# Altium schematic symbol library lib_datalogger.SchLib: 1246 symbols (part 11 of 16) (continued)
## CMP-018-000030-1 (continued)
footprint CR1608-0603 (Chip Resistor; Body 1.6 x 0.8 mm (LxW typ))
pins: 1, 2

## CMP-018-000031-1
designator R?, comment RES 10K OHM 5% 1/4W 1206 SMD  Tolerance: 5%  Case/Package: 1206  Resistance: 100kR  Manufacturer: Susumu  Max Operating Temperature: 125°C  Min Operating Temperature: -55°C  Packaging: Tape and Reel  Composition: Thin Film
RES SMD 10K OHM 5% 1/4W 1206; Manufacturer Part Number: HRG3216P-1003-D-T1; Temperature Coefficient: 25ppm/°C; Length: 0.126inch; Features: Moisture Resistant,Automotive AEC-Q200,Anti-Sulfur; Source: mits.SchLib; Width: 0.065inch; Max Power Dissipation: 1/4W; Case Code (Imperial): 1206; RoHS: Yes; Case Code (Metric): 3216; Category: Chip SMD Resistors; ComponentLink1Description: http://industrial.panasonic.com/www-cgi/jvcr13pz.cgi?E+PZ+3+AOA0001+ERJ8GEYJ271V+7+WW; ComponentLink2Description: http://www.susumu.co.jp/common/pdf/n_catalog_partition24_en.pdf?src-supplier=Digi-Key; ComponentLink1URL: http://industrial.panasonic.com/www-cgi/jvcr13pz.cgi?E+PZ+3+AOA0001+ERJ8GEYJ271V+7+WW; Pricing 1: 1=0,97000, 10=0,83900, 100=0,58440 (USD); Stock 1: 1091; Height: 0.022inch; ComponentLink2URL: http://www.susumu.co.jp/common/pdf/n_catalog_partition24_en.pdf?src-supplier=Digi-Key; Design Item ID: RES 10K OHM 5% 1/4W 1206 SMD; Number of Terminations: 2
footprint CR1608-0603 (Chip Resistor; Body 1.6 x 0.8 mm (LxW typ))
footprint CR3216-1206 (Chip Capacitor; Body 3.2 x 1.6 mm (LxW typ))
pins: 1, 2

## CMP-018-000032-1
designator R?, comment RES 12K OHM 1% 1/8W 0805 SMD  Tolerance: ±1%  Manufacturer: Panasonic Electronic Components  Composition: Thick Film  Packaging: Cut Tape (CT)
RES SMD 12K OHM 1% 1/8W 0805; Manufacturer Part Number: ERJ-6ENF1202V; Temperature Coefficient: ±100ppm/°C; Power (Watts): 0.125W, 1/8W; Source: mits.SchLib; Number of Terminations: 2; ComponentLink1Description: https://industrial.panasonic.com/cdbs/www-data/pdf/RDA0000/AOA0000C283.pdf; Size / Dimension: 0.079" L x 0.049" W (2.00mm x 1.25mm); Height - Seated (Max): 0.028" (0.70mm); Pricing 1: 1=0.1, 10=0.036, 25=0.0264, 50=0.02, 100=0.0148, 250=0.01124, 500=0.009, 1000=0.00663 (USD); Package / Case: 0805 (2012 Metric); Failure Rate: -; Stock 1: 52615; Operating Temperature: -55°C ~ 155°C; Features: Automotive AEC-Q200; ComponentLink1URL: https://industrial.panasonic.com/cdbs/www-data/pdf/RDA0000/AOA0000C283.pdf; Part Status: Active; Category: Resistors; Resistance (Ohms): 12k; Supplier Device Package: 0805; RoHS: RoHS Compliant; Design Item ID: RES 12K OHM 1% 1/8W 0805 SMD
footprint CR1608-0603 (Chip Resistor; Body 1.6 x 0.8 mm (LxW typ))
footprint CR2012-0805 (Chip Capacitor)
pins: 1, 2

## CMP-018-000033-1
designator R?, comment RES 15K OHM 1% 1/2W 0805 SMD  Composition: Thick Film  Min Operating Temperature: -55°C  Resistance: 15kR  Voltage Rating: 150V  Packaging: Cut Tape  Case/Package: 0805  Manufacturer: Panasonic  Tolerance: 1%  Max Operating Temperature: 155°C
RES SMD 15 kohm   1% 1/2W 0805; Manufacturer Part Number: ERJ-P6WF1502V; Temperature Coefficient: 200ppm/°C; Power Rating: 500mW; Width: 0.049inch; Case Code (Imperial): 0805; REACH SVHC: No SVHC; Length: 0.079inch; ComponentLink2URL: https://datasheet.ciiva.com/48525/erjp-series-eng-tds-48525477.pdf?src-supplier=Distrelec; Category: Chip SMD Resistors; Number of Terminations: 2; Pricing 1: 1=0,54000, 10=0,41200, 100=0,17310, 1000=0,09552, 2500=0,08955 (USD); Voltage Rating (DC): 150V; ComponentLink1URL: http://www.yageo.com/documents/recent/PYu-RC_Group_51_RoHS_L_04.pdf; RoHS: Yes; ComponentLink1Description: http://www.yageo.com/documents/recent/PYu-RC_Group_51_RoHS_L_04.pdf; Design Item ID: RES 15K OHM 1% 1/2W 0805 SMD; Height: 0.03inch; Max Power Dissipation: 500mW; Termination: Flat; Contact Plating: Tin; ComponentLink2Description: https://datasheet.ciiva.com/48525/erjp-series-eng-tds-48525477.pdf?src-supplier=Distrelec; Stock 1: 4979; Source: mits.SchLib; Depth: 1.25mm; Case Code (Metric): 2012; Features: Automotive AEC-Q200
footprint CR1608-0603 (Chip Resistor; Body 1.6 x 0.8 mm (LxW typ))
footprint CR2012-0805 (Chip Capacitor)
pins: 1, 2

## CMP-018-000034-1
designator R?, comment RES 1K2 OHM 1% 1/8W 0805 SMD  Composition: Thick Film  Packaging: Cut Tape (CT)  Tolerance: ±1%  Manufacturer: Panasonic Electronic Components
RES SMD 1.2K OHM 1% 1/8W 0805; Manufacturer Part Number: ERJ-6ENF1201V; Power (Watts): 0.125W, 1/8W; Temperature Coefficient: ±100ppm/°C; Size / Dimension: 0.079" L x 0.049" W (2.00mm x 1.25mm); RoHS: RoHS Compliant; Category: Resistors; Resistance (Ohms): 1.2k; ComponentLink1URL: https://industrial.panasonic.com/cdbs/www-data/pdf/RDA0000/AOA0000C283.pdf; Height - Seated (Max): 0.028" (0.70mm); Operating Temperature: -55°C ~ 155°C; Package / Case: 0805 (2012 Metric); Part Status: Active; Stock 1: 37968; ComponentLink1Description: https://industrial.panasonic.com/cdbs/www-data/pdf/RDA0000/AOA0000C283.pdf; Failure Rate: -; Pricing 1: 1=0.1, 10=0.036, 25=0.0264, 50=0.02, 100=0.0148, 250=0.01124, 500=0.009, 1000=0.00663 (USD); Supplier Device Package: 0805; Design Item ID: RES 1K2 OHM 1% 1/8W 0805 SMD; Source: mits.SchLib; Features: Automotive AEC-Q200
footprint CR1608-0603 (Chip Resistor; Body 1.6 x 0.8 mm (LxW typ))
footprint CR2012-0805 (Chip Capacitor)
pins: 1, 2

## CMP-018-000035-1
designator R?, comment RES 22K OHM 1% 1/8W 0805 SMD  Composition: Thick Film  Packaging: Cut Tape (CT)  Manufacturer: Panasonic Electronic Components  Tolerance: ±1%
RES SMD 22K OHM 1% 1/8W 0805; Manufacturer Part Number: ERJ-6ENF2202V; Temperature Coefficient: ±100ppm/°C; Power (Watts): 0.125W, 1/8W; Category: Resistors; Supplier Device Package: 0805; Source: mits.SchLib; Package / Case: 0805 (2012 Metric); RoHS: RoHS Compliant; Part Status: Active; Resistance (Ohms): 22k; ComponentLink1Description: https://industrial.panasonic.com/cdbs/www-data/pdf/RDA0000/AOA0000C283.pdf; Failure Rate: -; Size / Dimension: 0.079" L x 0.049" W (2.00mm x 1.25mm); Stock 1: 26406; Features: Automotive AEC-Q200; Design Item ID: RES 22K OHM 1% 1/8W 0805 SMD; Height - Seated (Max): 0.028" (0.70mm); Pricing 1: 1=0.1, 10=0.036, 25=0.0264, 50=0.02, 100=0.0148, 250=0.01124, 500=0.009, 1000=0.00663 (USD); Operating Temperature: -55°C ~ 155°C; ComponentLink1URL: https://industrial.panasonic.com/cdbs/www-data/pdf/RDA0000/AOA0000C283.pdf
footprint CR1608-0603 (Chip Resistor; Body 1.6 x 0.8 mm (LxW typ))
footprint CR2012-0805 (Chip Capacitor)
pins: 1, 2

## CMP-018-000036-1
designator R?, comment RES 22R OHM 1% 1/8W 0805 SMD  Packaging: Cut Tape (CT)  Manufacturer: Yageo  Composition: Thick Film  Tolerance: ±1%
RES SMD 22 OHM 1% 1/8W 0805; Manufacturer Part Number: RC0805FR-0722RL; Resistance (Ohms): 22; Temperature Coefficient: ±100ppm/°C; Power (Watts): 0.125W, 1/8W; Part Status: Active; Design Item ID: RES 22R OHM 1% 1/8W 0805 SMD; Pricing 1: 1=0.1, 10=0.019, 25=0.0136, 50=0.0104, 100=0.0077, 250=0.00584, 500=0.00468, 1000=0.00345 (USD); Failure Rate: -; Height - Seated (Max): 0.024" (0.60mm); Features: Moisture Resistant; Source: mits.SchLib; Size / Dimension: 0.079" L x 0.049" W (2.00mm x 1.25mm); RoHS: RoHS Compliant; Operating Temperature: -55°C ~ 155°C; ComponentLink1URL: http://www.yageo.com/documents/recent/PYu-RC_Group_51_RoHS_L_6.pdf; Package / Case: 0805 (2012 Metric); Stock 1: 666127; ComponentLink1Description: http://www.yageo.com/documents/recent/PYu-RC_Group_51_RoHS_L_6.pdf; Category: Resistors; Supplier Device Package: 0805
footprint CR1608-0603 (Chip Resistor; Body 1.6 x 0.8 mm (LxW typ))
footprint CR2012-0805 (Chip Capacitor)
pins: 1, 2

## CMP-018-000037-1
designator R?, comment RES 274 OHM 1% 1/8W 0805 SMD  Packaging: Cut Tape (CT)  Manufacturer: Panasonic Electronic Components  Composition: Thick Film  Tolerance: ±1%
RES SMD 274 OHM 1% 1/8W 0805; Manufacturer Part Number: ERJ-6ENF2740V; Resistance (Ohms): 274; Temperature Coefficient: ±100ppm/°C; Power (Watts): 0.125W, 1/8W; Package / Case: 0805 (2012 Metric); Operating Temperature: -55°C ~ 155°C; ComponentLink1URL: https://industrial.panasonic.com/cdbs/www-data/pdf/RDA0000/AOA0000C283.pdf; Source: mits.SchLib; Part Status: Active; Failure Rate: -; ComponentLink1Description: https://industrial.panasonic.com/cdbs/www-data/pdf/RDA0000/AOA0000C283.pdf; Supplier Device Package: 0805; Height - Seated (Max): 0.028" (0.70mm); RoHS: RoHS Compliant; Pricing 1: 1=0.1, 10=0.036, 25=0.0264, 50=0.02, 100=0.0148, 250=0.01124, 500=0.009, 1000=0.00663 (USD); Category: Resistors; Design Item ID: RES 274 OHM 1% 1/8W 0805 SMD; Size / Dimension: 0.079" L x 0.049" W (2.00mm x 1.25mm); Stock 1: 55174; Features: Automotive AEC-Q200
footprint CR1608-0603 (Chip Resistor; Body 1.6 x 0.8 mm (LxW typ))
footprint CR2012-0805 (Chip Capacitor)
pins: 1, 2

## CMP-018-000038-1
designator R?, comment RES 2K2 OHM 1/8W 5% 0805 SMD  Composition: Thick Film  Tolerance: ±5%  Packaging: Cut Tape (CT)  Manufacturer: Panasonic Electronic Components
RES SMD 2.2K OHM 5% 1/8W 0805; Part#: ERJ-6GEYJ222V; Power (Watts): 0.125W, 1/8W; Temperature Coefficient: ±200ppm/°C; eVendor: Digi-Key; MSRP: 0,00459; eVendorPrice: 0,10; eVendor#: P2.2KACT-ND; Stock 1: 100522; ComponentLink1Description: http://industrial.panasonic.com/www-cgi/jvcr13pz.cgi?E+PZ+3+AOA0001+ERJ6GEYJ222V+7+WW; Features: Automotive AEC-Q200; Failure Rate: -; Part Status: Active; Design Item ID: RES 2K2 OHM 1/8W 5% 0805 SMD; Obs: ERJ-6GEYJ222V; Datasheet: http://industrial.panasonic.com/www-cgi/jvcr13pz.cgi?E+PZ+3+AOA0001+ERJ6GEYJ222V+7+WW; Height - Seated (Max): 0.028" (0.70mm); Operating Temperature: -55°C ~ 155°C; Category: Resistors; MOQ: 2500; ComponentLink1URL: http://industrial.panasonic.com/www-cgi/jvcr13pz.cgi?E+PZ+3+AOA0001+ERJ6GEYJ222V+7+WW; Package / Case: 0805 (2012 Metric); Resistance (Ohms): 2.2k; Source: mits.SchLib; Manufacturer Part Number: ERJ-6GEYJ222V; Number of Terminations: 2; RoHS: RoHS Compliant; Size / Dimension: 0.079" L x 0.049" W (2.00mm x 1.25mm); Supplier Device Package: 0805; Pricing 1: 1=0.1, 10=0.025, 25=0.018, 50=0.0136, 100=0.01, 250=0.00764, 500=0.00612, 1000=0.00451 (USD)
footprint CR1608-0603 (Chip Resistor; Body 1.6 x 0.8 mm (LxW typ))
footprint CR2012-0805 (Chip Capacitor)
pins: 1, 2

## CMP-018-000039-2
designator R?, comment RES 33K OHM 5% 1/8W 0805 SMD  Min Operating Temperature: -55°C  Max Operating Temperature: 155°C  Case/Package: 0805  Packaging: Tape and Reel  Tolerance: 5%  Resistance: 33kR  RoHS Compliant: Yes
Res Thick Film 0805 33K Ohm 5% 0.125W(1/8W) ±200ppm/C Pad SMD Automotive T/R; Temperature Coefficient: 100ppm/°C; Max Power Dissipation: 125mW; Resistor Type: Thick Film; Mount: Surface Mount; Military Standard: Not; Size Code: 0805; Depth: 1.25mm; Case Code (Metric): 2012; Width: 0.049inch; Series: RMCF; Contact Plating: Tin,Matte; Radiation Hardening: No; Height: 0.026inch; Length: 2mm; Construction: Rectangular; Features: Automotive AEC-Q200; Power Rating: 125mW; Number of Terminations: 2; Lead Free: Lead Free; Case Code (Imperial): 0805
footprint CR2012-0805 (Chip Capacitor)
pins: 1, 2

## CMP-018-000040-1
designator R?, comment RES 34K OHM 1% 1/8W 0805 SMD  Manufacturer: Panasonic  Packaging: Tape and Reel  Composition: Thick Film  Tolerance: 1%  Resistance: 34kR  Package Quantity: 1  Max Operating Temperature: 155°C  Case/Package: 0805  Min Operating Temperature: -55°C  Voltage Rating: 150V
RES SMD 34K OHM 1% 1/8W 0805; Manufacturer Part Number: ERJ-6ENF3402V; Power Rating: 125mW; Temperature Coefficient: 100ppm/°C; ComponentLink1URL: http://www.yageo.com/documents/recent/PYu-RC_Group_51_RoHS_L_6.pdf; Category: Chip SMD Resistors; ComponentLink2URL: https://datasheet.ciiva.com/24163/aoa0000ce2-24163673.pdf?src-supplier=Mouser; REACH SVHC: No SVHC; Source: mits.SchLib; Termination: SMD/SMT; Stock 1: 43453; ComponentLink3URL: https://datasheet.ciiva.com/30170/aoa0000ce2-30170570.pdf?src-supplier=Onlinecomponents.com; ComponentLink1Description: http://www.yageo.com/documents/recent/PYu-RC_Group_51_RoHS_L_6.pdf; Height: 0.6mm; ComponentLink4Description: https://datasheet.ciiva.com/7870/aoa0000ce2-7870841.pdf?src-supplier=Element14; ComponentLink6Description: https://datasheet.ciiva.com/16768/70260748-16768797.pdf?src-supplier=Allied+Electronics; ComponentLink5Description: https://datasheet.ciiva.com/16760/70260748-16760441.pdf?src-supplier=Allied+Electronics; Case Code (Imperial): 0805; ComponentLink5URL: https://datasheet.ciiva.com/16760/70260748-16760441.pdf?src-supplier=Allied+Electronics; Mount: Surface Mount; Number of Terminations: 2; RoHS: Yes; Length: 2mm; ComponentLink4URL: https://datasheet.ciiva.com/7870/aoa0000ce2-7870841.pdf?src-supplier=Element14; ComponentLink6URL: https://datasheet.ciiva.com/16768/70260748-16768797.pdf?src-supplier=Allied+Electronics; Max Power Dissipation: 125mW; ComponentLink3Description: https://datasheet.ciiva.com/30170/aoa0000ce2-30170570.pdf?src-supplier=Onlinecomponents.com; Design Item ID: RES 34K OHM 1% 1/8W 0805 SMD; Radiation Hardening: No; Lead Free: Lead Free; Weight: 0.000194oz; Pricing 1: 1=0,10000, 10=0,07200, 100=0,02750, 1000=0,01210, 2500=0,01045 (USD); Case Code (Metric): 2012; Depth: 1.25mm; Features: Automotive AEC-Q200; Voltage Rating (DC): 150V; ComponentLink2Description: https://datasheet.ciiva.com/24163/aoa0000ce2-24163673.pdf?src-supplier=Mouser; Width: 0.049inch; Military Standard: Not; Contact Plating: Tin
footprint CR1608-0603 (Chip Resistor; Body 1.6 x 0.8 mm (LxW typ))
footprint CR2012-0805 (Chip Capacitor)
pins: 1, 2

## CMP-018-000041-1
designator R?, comment RES 390 OHM 1% 1/8W 0805 SMD  Tolerance: ±1%  Packaging: Cut Tape (CT)
RES SMD 390 OHM 1% 1/8W 0805; Manufacturer Part Number 1: 0805W8F3900T5E; Manufacturer 1: Uniroyal; Resistance (Ohms): 390; Power (Watts): 0.125W, 1/8W; Supplier Device Package: 0805; RoHS: RoHS Compliant; Source: mits.SchLib; Number of Terminations: 2; Part Status: Active; Design Item ID: RES 390 OHM 1% 1/8W 0805 SMD; Category: Resistors; ComponentLink1URL: http://industrial.panasonic.com/www-cgi/jvcr13pz.cgi?E+PZ+3+AOA0002+ERJ6ENF3652V+7+WW; ComponentLink1Description: http://industrial.panasonic.com/www-cgi/jvcr13pz.cgi?E+PZ+3+AOA0002+ERJ6ENF3652V+7+WW; Package / Case: 0805 (2012 Metric)
footprint CR1608-0603 (Chip Resistor; Body 1.6 x 0.8 mm (LxW typ))
footprint CR2012-0805 (Chip Capacitor)
pins: 1, 2

## CMP-018-000042-1
designator R?, comment RES 47R OHM 1% 1/4W 1206 SMD  Packaging: Cut Tape (CT)  Tolerance: ±1%  Composition: Thick Film  Manufacturer: Panasonic Electronic Components
RES SMD 47 OHM 1% 1/4W 1206; Manufacturer Part Number: ERJ-8ENF47R0V; Power (Watts): 0.25W, 1/4W; Resistance (Ohms): 47; Temperature Coefficient: ±100ppm/°C; Size / Dimension: 0.126" L x 0.063" W (3.20mm x 1.60mm); Pricing 1: 1=0.1, 10=0.046, 25=0.0336, 50=0.0256, 100=0.0189, 250=0.0144, 500=0.01152, 1000=0.00848 (USD); Category: Resistors; Operating Temperature: -55°C ~ 155°C; Part Status: Active; Features: Automotive AEC-Q200; ComponentLink1URL: https://industrial.panasonic.com/cdbs/www-data/pdf/RDA0000/AOA0000C283.pdf; Failure Rate: -; Design Item ID: RES 47R OHM 1% 1/4W 1206 SMD; Height - Seated (Max): 0.028" (0.70mm); Source: mits.SchLib; RoHS: RoHS Compliant; ComponentLink1Description: https://industrial.panasonic.com/cdbs/www-data/pdf/RDA0000/AOA0000C283.pdf; Package / Case: 1206 (3216 Metric); Stock 1: 129296; Supplier Device Package: 1206
footprint CR1608-0603 (Chip Resistor; Body 1.6 x 0.8 mm (LxW typ))
footprint CR3216-1206 (Chip Capacitor; Body 3.2 x 1.6 mm (LxW typ))
pins: 1, 2

## CMP-018-000043-1
designator R?, comment RES 5K6 OHM 1% 1/8W 0805 SMD  Min Operating Temperature: -55°C  Manufacturer: TE Connectivity  Case/Package: 0805  Max Operating Temperature: 125°C  Packaging: Tape and Reel  Resistance: 5.6kR  Tolerance: 1%  Voltage Rating: 150V  Composition: Thick Film
SMD CRG0805 1% 5K6; Manufacturer Part Number: CRG0805F5K6; Temperature Coefficient: 100ppm/°C; Number of Resistors: 1; Power Rating: 125mW; Radiation Hardening: No; Mount: Surface Mount; ComponentLink2URL: https://datasheet.ciiva.com/12563/eng-ds-1773204-g-12563327.pdf?src-supplier=Mouser; Case Code (Imperial): 0805; Category: Chip SMD Resistors; ComponentLink1URL: https://datasheet.ciiva.com/11809/0900766b800a696e-11809932.pdf?src-supplier=RSComponents; Source: mits.SchLib; ELV: Compliant; RoHS: Yes; Pricing 1: 1=0,10000, 10=0,04900, 100=0,02000, 1000=0,00898, 2500=0,00780 (USD); Number of Terminations: 2; Design Item ID: RES 5K6 OHM 1% 1/8W 0805 SMD; Depth: 1.25mm; Width: 1.25mm; Length: 2mm; ComponentLink1Description: https://datasheet.ciiva.com/11809/0900766b800a696e-11809932.pdf?src-supplier=RSComponents; Case Code (Metric): 2012; Height: 0.55mm; Termination: Solder; Stock 1: 27945; ComponentLink2Description: https://datasheet.ciiva.com/12563/eng-ds-1773204-g-12563327.pdf?src-supplier=Mouser
footprint CR1608-0603 (Chip Resistor; Body 1.6 x 0.8 mm (LxW typ))
footprint CR2012-0805 (Chip Capacitor)
pins: 1, 2

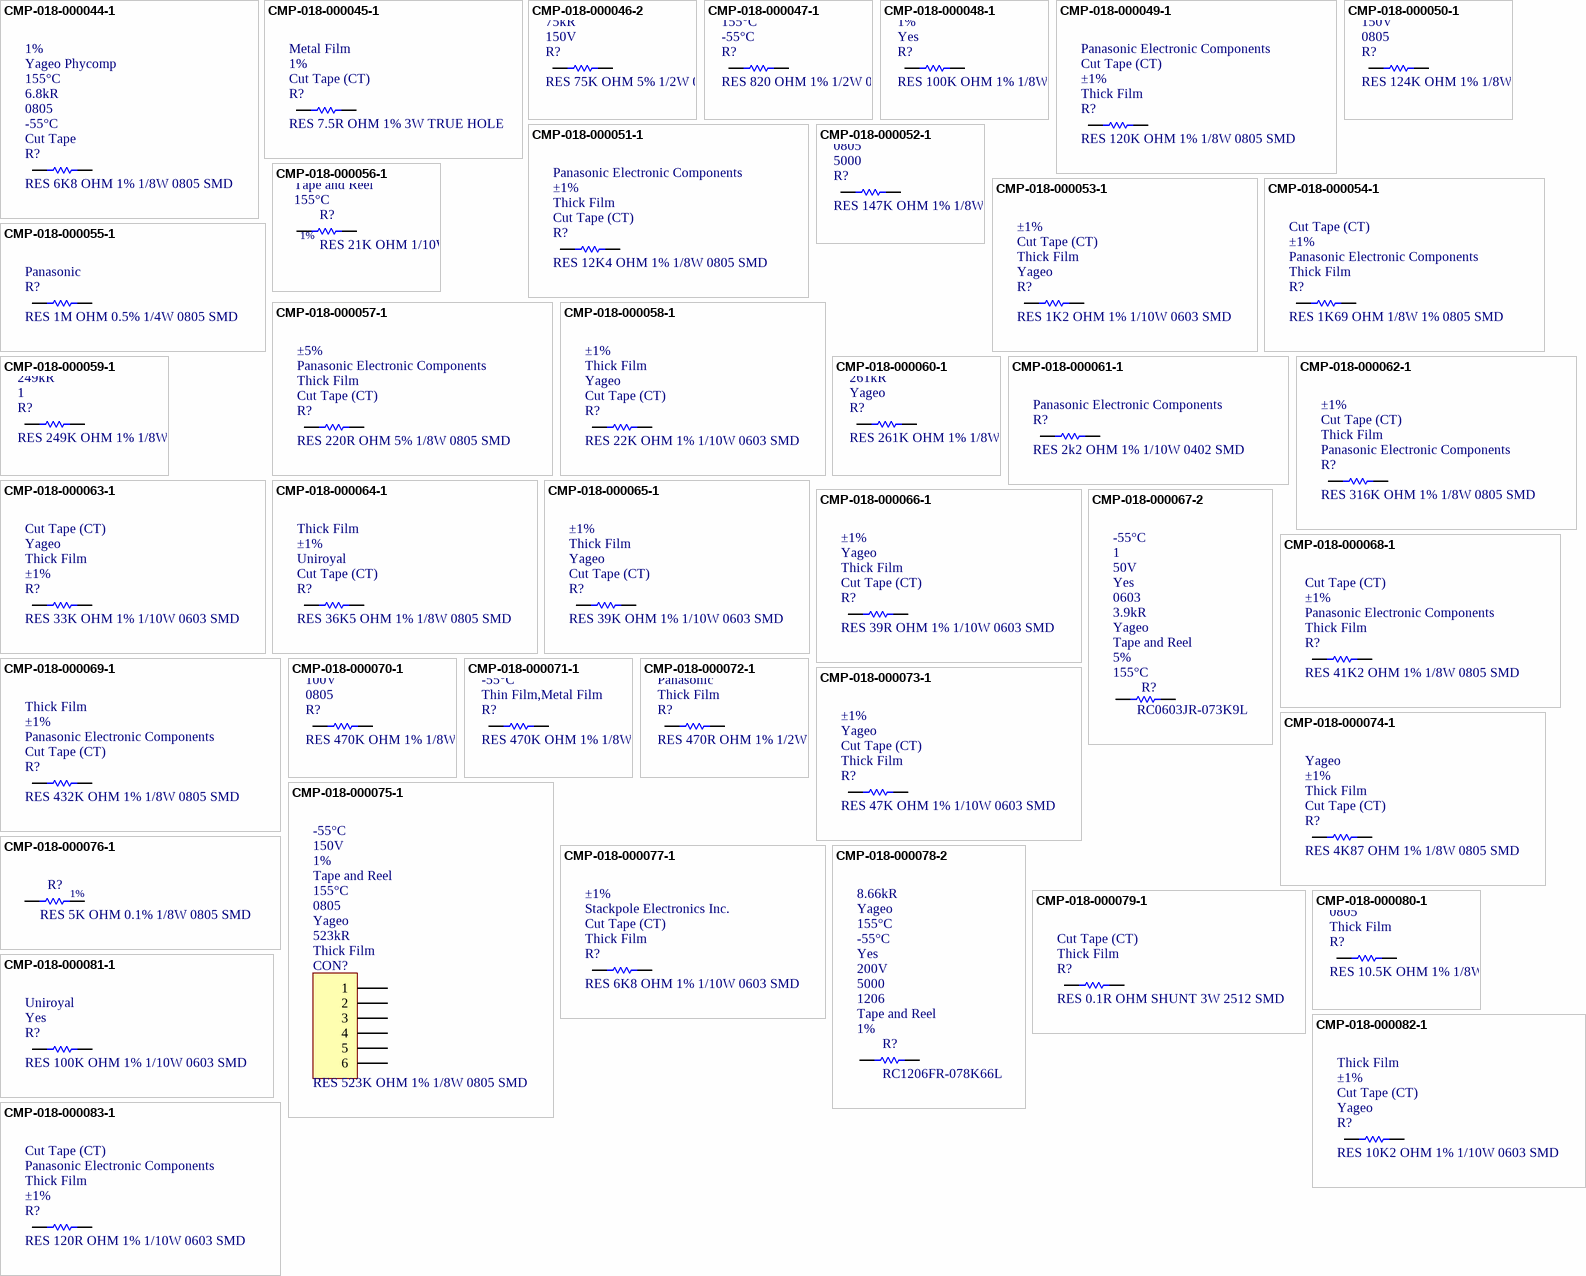
[diagram p33: symbols CMP-018-000044-1 to CMP-018-000083-1]

## CMP-018-000044-1
designator R?, comment RES 6K8 OHM 1% 1/8W 0805 SMD  Packaging: Cut Tape  Min Operating Temperature: -55°C  Case/Package: 0805  Resistance: 6.8kR  Max Operating Temperature: 155°C  Manufacturer: Yageo Phycomp  Tolerance: 1%
RES SMD 6K8 OHM 1% 1/8W 0805; Manufacturer Part Number: RC0805FR-076K8L; Power Rating: 125mW; Working Voltage: 150V; Temperature Coefficient: 100ppm/°C; Height: 0.5mm; RoHS: Yes; ComponentLink5URL: http://www.yageo.com/documents/recent/PYu-RC_Group_51_RoHS_L_10.pdf?src-supplier=Digi-Key; Depth: 1.25mm; Number of Pins: 2; ComponentLink3URL: http://www.farnell.com/datasheets/2167052.pdf?src-supplier=Farnell; Length: 2mm; Stock 1: 3961465; Source: mits.SchLib; ComponentLink5Description: http://www.yageo.com/documents/recent/PYu-RC_Group_51_RoHS_L_10.pdf?src-supplier=Digi-Key; Mount: Surface Mount; Number of Terminations: 2; ComponentLink2Description: http://www.mouser.com/ds/2/447/Yageo_08112016_RC0805-968729.pdf?src-supplier=Mouser; Voltage Rating (DC): 150V; Width: 1.25mm; REACH SVHC: No SVHC; Category: Chip SMD Resistors; Design Item ID: RES 6K8 OHM 1% 1/8W 0805 SMD; ComponentLink4URL: http://www.yageo.com/documents/recent/PYu-RC_Group_51_RoHS_L_9.pdf?src-supplier=Digi-Key; ComponentLink4Description: http://www.yageo.com/documents/recent/PYu-RC_Group_51_RoHS_L_9.pdf?src-supplier=Digi-Key; ComponentLink3Description: http://www.farnell.com/datasheets/2167052.pdf?src-supplier=Farnell; ComponentLink1URL: https://www.seielect.com/Catalog/SEI-RMCF_RMCP.pdf; ComponentLink2URL: http://www.mouser.com/ds/2/447/Yageo_08112016_RC0805-968729.pdf?src-supplier=Mouser; Pricing 1: 1=0,10000, 10=0,04000, 100=0,01630, 1000=0,00731, 2500=0,00635 (USD); Lead Free: Lead Free; ComponentLink1Description: https://www.seielect.com/Catalog/SEI-RMCF_RMCP.pdf
footprint CR1608-0603 (Chip Resistor; Body 1.6 x 0.8 mm (LxW typ))
footprint CR2012-0805 (Chip Capacitor)
pins: 1, 2

## CMP-018-000045-1
designator R?, comment RES 7.5R OHM 1% 3W TRUE HOLE  Packaging: Cut Tape (CT)  Tolerance: 1%  Composition: Metal Film
Manufeacturer Part Number 1: MF3WS-7.5Ω±1% T; Manufeacturer 1: CCO(Chian Chia Elec); Resistance (Ohms): 7.5; Design Item ID: RES 7.5R OHM 1% 3W TRUE HOLE; Power (Watts): 3W; Source: mits.SchLib; ComponentLink1URL: https://datasheet.lcsc.com/szlcsc/1811131131_CCO-Chian-Chia-Elec-MF3WS-7-5R-1-T_C119686.pdf; Category: Resistors; RoHS: RoHS Compliant; Supplier Device Package: Axial; Features: Resistor; Part Status: Active; Package / Case: Axial; ComponentLink1Description: datasheet
footprint CR1608-0603 (Chip Resistor; Body 1.6 x 0.8 mm (LxW typ))
footprint RES TRUE_HOLE
pins: 1, 2

## CMP-018-000046-2
designator R?, comment RES 75K OHM 5% 1/2W 0805 SMD  Voltage Rating: 150V  Resistance: 75kR  Packaging: Tape and Reel  Case/Package: 0805  Package Quantity: 1  Composition: Thick Film  Manufacturer: Panasonic  Max Operating Temperature: 155°C  Min Operating Temperature: -55°C  Tolerance: 5%
RES SMD 75K OHM 5% 1/2W 0805; Manufacturer Part Number: ERJ-P06J753V; Power Rating: 500mW; Temperature Coefficient: 200ppm/°C; Case Code (Metric): 2012; ComponentLink4URL: https://datasheet.ciiva.com/17208/aoa0000ce4-17208715.pdf?src-supplier=Avnet+Europe; Mount: Surface Mount; Voltage Rating (DC): 150V; ComponentLink4Description: https://datasheet.ciiva.com/17208/aoa0000ce4-17208715.pdf?src-supplier=Avnet+Europe; Design Item ID: RES 75K OHM 5% 1/2W 0805 SMD; Features: Automotive AEC-Q200; Contact Plating: Tin; Depth: 1.25mm; Category: Chip SMD Resistors; Case Code (Imperial): 0805; Height: 0.028inch; Pricing 1: 1=0,11000, 10=0,10300, 100=0,03960, 1000=0,01742, 2500=0,01505 (USD); Length: 2mm; Stock 1: 12699; RoHS: Yes; Lead Free: Contains Lead; ComponentLink3URL: https://datasheet.ciiva.com/9187/aoa0000ce4-9187849.pdf?src-supplier=Avnet; ComponentLink1URL: https://industrial.panasonic.com/cdbs/www-data/pdf/RDA0000/AOA0000C283.pdf; ComponentLink1Description: https://industrial.panasonic.com/cdbs/www-data/pdf/RDA0000/AOA0000C283.pdf; Radiation Hardening: No; Number of Terminations: 2; Width: 1.2mm; ComponentLink2Description: https://datasheet.ciiva.com/24042/aoa0000ce4-64075-24042568.pdf?src-supplier=Mouser; ComponentLink3Description: https://datasheet.ciiva.com/9187/aoa0000ce4-9187849.pdf?src-supplier=Avnet; Source: mits.SchLib; Military Standard: Not; Max Power Dissipation: 500mW; ComponentLink2URL: https://datasheet.ciiva.com/24042/aoa0000ce4-64075-24042568.pdf?src-supplier=Mouser
footprint CR1608-0603 (Chip Resistor; Body 1.6 x 0.8 mm (LxW typ))
footprint CR2012-0805 (Chip Capacitor)
pins: 1, 2

## CMP-018-000047-1
designator R?, comment RES 820 OHM 1% 1/2W 0805 SMD  Min Operating Temperature: -55°C  Max Operating Temperature: 155°C  Packaging: Cut Tape  Manufacturer: Panasonic  Resistance: 820R  Case/Package: 0805  Tolerance: 1%  Voltage Rating: 150V  Composition: Thick Film
RES SMD 820 OHM 1% 1/2W 0805; Manufacturer Part Number: ERJP6WF8200V; Temperature Coefficient: 200ppm/°C; Power Rating: 500mW; ComponentLink1URL: http://www.yageo.com/documents/recent/PYu-RC_Group_51_RoHS_L_7.pdf; ComponentLink5Description: https://datasheet.ciiva.com/48536/erjp-series-eng-tds-48536302.pdf?src-supplier=Distrelec; ComponentLink7Description: https://datasheet.ciiva.com/48531/aoa0000ce4-48531125.pdf?src-supplier=Avnet; ComponentLink2URL: https://datasheet.ciiva.com/48531/aoa0000ce4-48531226.pdf?src-supplier=Avnet; REACH SVHC: No SVHC; Depth: 1.25mm; Height: 0.03inch; Width: 0.049inch; Termination: Flat; ComponentLink6Description: https://datasheet.ciiva.com/6138/1790600-6138383.pdf?src-supplier=Farnell; Case Code (Imperial): 0805; ComponentLink7URL: https://datasheet.ciiva.com/48531/aoa0000ce4-48531125.pdf?src-supplier=Avnet; ComponentLink8URL: https://datasheet.ciiva.com/6137/1790600-6137853.pdf?src-supplier=Farnell; RoHS: Yes; ComponentLink6URL: https://datasheet.ciiva.com/6138/1790600-6138383.pdf?src-supplier=Farnell; ComponentLink4Description: https://datasheet.ciiva.com/48531/aoa0000ce4-48531222.pdf?src-supplier=Avnet; Case Code (Metric): 2012; Voltage Rating (DC): 150V; Max Power Dissipation: 500mW; ComponentLink2Description: https://datasheet.ciiva.com/48531/aoa0000ce4-48531226.pdf?src-supplier=Avnet; ComponentLink4URL: https://datasheet.ciiva.com/48531/aoa0000ce4-48531222.pdf?src-supplier=Avnet; Design Item ID: RES 820 OHM 1% 1/2W 0805 SMD; Contact Plating: Tin; Category: Chip SMD Resistors; ComponentLink3Description: https://datasheet.ciiva.com/7830/1790600-7830869.pdf?src-supplier=Element14; Number of Terminations: 2; ComponentLink5URL: https://datasheet.ciiva.com/48536/erjp-series-eng-tds-48536302.pdf?src-supplier=Distrelec; Pricing 1: 1=0,51300, 10=0,27930, 25=0,27650, 100=0,14350, 250=0,14190, 500=0,14060, 1000=0,08550 (USD); ComponentLink8Description: https://datasheet.ciiva.com/6137/1790600-6137853.pdf?src-supplier=Farnell; Features: Automotive AEC-Q200; Stock 1: 2072; ComponentLink1Description: http://www.yageo.com/documents/recent/PYu-RC_Group_51_RoHS_L_7.pdf; ComponentLink3URL: https://datasheet.ciiva.com/7830/1790600-7830869.pdf?src-supplier=Element14; Length: 0.079inch; Source: mits.SchLib
footprint CR1608-0603 (Chip Resistor; Body 1.6 x 0.8 mm (LxW typ))
footprint CR1608-0603 (Chip Resistor; Body 1.6 x 0.8 mm (LxW typ))
pins: 1, 2

## CMP-018-000048-1
designator R?, comment RES 100K OHM 1% 1/8W 0805 SMD  RoHS Compliant: Yes  Tolerance: 1%  Min Operating Temperature: -55°C  Voltage Rating: 150V  Lead Pitch: 0.4mm  Max Operating Temperature: 155°C  Package Quantity: 1  Case/Package: 0805  Resistance: 100kR  Manufacturer: Yageo  Packaging: Tape and Reel
Res Thick Film 0805 100K Ohm 1% 1/8W ±100ppm/°C Molded SMD Paper T/R; Manufacturer Part Number: RC0805FR-07100KL; Power Rating: 125mW; ComponentLink2Description: http://www.susumu.co.jp/common/pdf/n_catalog_partition24_en.pdf?src-supplier=Digi-Key; ComponentLink10Description: https://datasheet.ciiva.com/7941/1697719-7941676.pdf?src-supplier=Element14; Temperature Coefficient: 100ppm/°C; Number of Terminations: 2; Construction: Rectangular; ComponentLink1Description: http://industrial.panasonic.com/www-cgi/jvcr13pz.cgi?E+PZ+3+AOA0001+ERJ8GEYJ271V+7+WW; RoHS: Yes; ComponentLink10URL: https://datasheet.ciiva.com/7941/1697719-7941676.pdf?src-supplier=Element14; ComponentLink8Description: https://datasheet.ciiva.com/2457/pyu-r-int-thick-7-2457019.pdf?src-supplier=Digi-Key; ComponentLink6URL: https://datasheet.ciiva.com/2457/pyu-r-int-thick-7-2457018.pdf?src-supplier=Digi-Key; Lead Free: Lead Free; ComponentLink12Description: https://datasheet.ciiva.com/7941/1697719-7941678.pdf?src-supplier=Element14; Pricing 1: 1=0,10000, 10=0,04200, 100=0,01690, 1000=0,00759, 2500=0,00659 (USD); ComponentLink11URL: https://datasheet.ciiva.com/7941/1686128-7941677.pdf?src-supplier=Element14; ComponentLink1URL: http://industrial.panasonic.com/www-cgi/jvcr13pz.cgi?E+PZ+3+AOA0001+ERJ8GEYJ271V+7+WW; Voltage Rating (DC): 150V; Military Standard: Not; Width: 0.049inch; ComponentLink4URL: https://datasheet.ciiva.com/2457/pyu-r-int-thick-7-2457017.pdf?src-supplier=Digi-Key; ComponentLink5URL: https://datasheet.ciiva.com/12667/rc0805-12667001.pdf?src-supplier=Mouser; ComponentLink13Description: https://datasheet.ciiva.com/22747/444164-22747534.pdf?src-supplier=Element14; Height: 0.024inch; Number of Pins: 2; Max Power Dissipation: 125mW; Source: mits.SchLib; ComponentLink11Description: https://datasheet.ciiva.com/7941/1686128-7941677.pdf?src-supplier=Element14; Features: Moisture Resistant; ComponentLink3Description: https://datasheet.ciiva.com/11808/0900766b8106beab-11808858.pdf?src-supplier=RSComponents; ComponentLink12URL: https://datasheet.ciiva.com/7941/1697719-7941678.pdf?src-supplier=Element14; Depth: 1.25mm; Resistor Type: Thick Film; Category: Chip SMD Resistors; ComponentLink13URL: https://datasheet.ciiva.com/22747/444164-22747534.pdf?src-supplier=Element14; Case Code (Imperial): 0805; Length: 2mm; ComponentLink7Description: https://datasheet.ciiva.com/16747/rc0805-16747226.pdf?src-supplier=Future+Electronics; ComponentLink9Description: https://datasheet.ciiva.com/7660/38627-7660796.pdf?src-supplier=Element14; Size Code: 0805; Resistance Tolerance: 1%; Technology: THICK FILM; Termination: SMD/SMT; Design Item ID: RES 100K OHM 1% 1/8W 0805 SMD; ComponentLink3URL: https://datasheet.ciiva.com/11808/0900766b8106beab-11808858.pdf?src-supplier=RSComponents; Stock 1: 1221722; REACH SVHC: Unknown; ComponentLink9URL: https://datasheet.ciiva.com/7660/38627-7660796.pdf?src-supplier=Element14; Series: RC; ComponentLink8URL: https://datasheet.ciiva.com/2457/pyu-r-int-thick-7-2457019.pdf?src-supplier=Digi-Key; ComponentLink5Description: https://datasheet.ciiva.com/12667/rc0805-12667001.pdf?src-supplier=Mouser; ComponentLink2URL: http://www.susumu.co.jp/common/pdf/n_catalog_partition24_en.pdf?src-supplier=Digi-Key; ComponentLink4Description: https://datasheet.ciiva.com/2457/pyu-r-int-thick-7-2457017.pdf?src-supplier=Digi-Key; ComponentLink6Description: https://datasheet.ciiva.com/2457/pyu-r-int-thick-7-2457018.pdf?src-supplier=Digi-Key; Case Code (Metric): 2012; ComponentLink7URL: https://datasheet.ciiva.com/16747/rc0805-16747226.pdf?src-supplier=Future+Electronics
footprint CR1608-0603 (Chip Resistor; Body 1.6 x 0.8 mm (LxW typ))
footprint CR2012-0805 (Chip Capacitor)
pins: 1, 2

## CMP-018-000049-1
designator R?, comment RES 120K OHM 1% 1/8W 0805 SMD  Composition: Thick Film  Tolerance: ±1%  Packaging: Cut Tape (CT)  Manufacturer: Panasonic Electronic Components
RES SMD 120K OHM 1% 1/8W 0805; Manufacturer Part Number: ERJ-6ENF1203V; Temperature Coefficient: ±100ppm/°C; Power (Watts): 0.125W, 1/8W; Features: Automotive AEC-Q200; Part Status: Active; Design Item ID: RES 120K OHM 1% 1/8W 0805 SMD; Package / Case: 0805 (2012 Metric); RoHS: RoHS Compliant; ComponentLink1URL: https://industrial.panasonic.com/cdbs/www-data/pdf/RDA0000/AOA0000C283.pdf; Failure Rate: -; Source: mits.SchLib; Number of Terminations: 2; Supplier Device Package: 0805; Operating Temperature: -55°C ~ 155°C; Category: Resistors; Stock 1: 64058; Size / Dimension: 0.079" L x 0.049" W (2.00mm x 1.25mm); Height - Seated (Max): 0.028" (0.70mm); Resistance (Ohms): 120k; Pricing 1: 1=0.1, 10=0.036, 25=0.0264, 50=0.02, 100=0.0148, 250=0.01124, 500=0.009, 1000=0.00663 (USD); ComponentLink1Description: https://industrial.panasonic.com/cdbs/www-data/pdf/RDA0000/AOA0000C283.pdf
footprint CR1608-0603 (Chip Resistor; Body 1.6 x 0.8 mm (LxW typ))
footprint CR2012-0805 (Chip Capacitor)
pins: 1, 2
